# Altium integrated library myIOT_lib.IntLib: 300 symbols (part 1 of 3) (continued)
## BD5291FVE-GTR
designator U?
BD5291FVE-GTR  Input/Output Full Swing  Low Input Offset Voltage  Operational Amplifier; Anunda_Code: M1954; MFG: Rohm Semiconductor; Supplier 1: ES; Supplier Part Number 1: 0176-1479-3; MFG P/N: BD5291FVE-GTR
footprint VSOF5 (SOT23, 5-Leads, Body 1.60x1.60mm, Pitch 0.50mm, IPC Medium Density)
pins: 1 IN+ (in), 2 VSS (power), 3 IN- (in), 4 OUT (out), 5 VDD (power)

## BD8306MUV-E2
designator U?
BD8306MUV-E2 Buck-Boost Converter 1.8V to 5.5V integrated 2.0A; Anunda_Code: D1095; MFG: Rohm Semiconductor; Value: BD8306MUV-E2; MFG P/N: BD8306MUV-E2
footprint VQFN016V3030 (QFN, 16-Leads, Body 3.00x3.00mm, Pitch 0.50mm, Thermal Pad 1.40x1.40mm, IPC Medium Density)
pins: 0 TPAD, 1 FB, 2 INV, 3 GND, 4 VOUT, 5 VOUT, 6 LX2, 7 LX2, 8 PGND, 9 PGND, 10 LX1, 11 LX1, 12 PVCC, 13 PVCC, 14 VCC, 15 STB, 16 RT

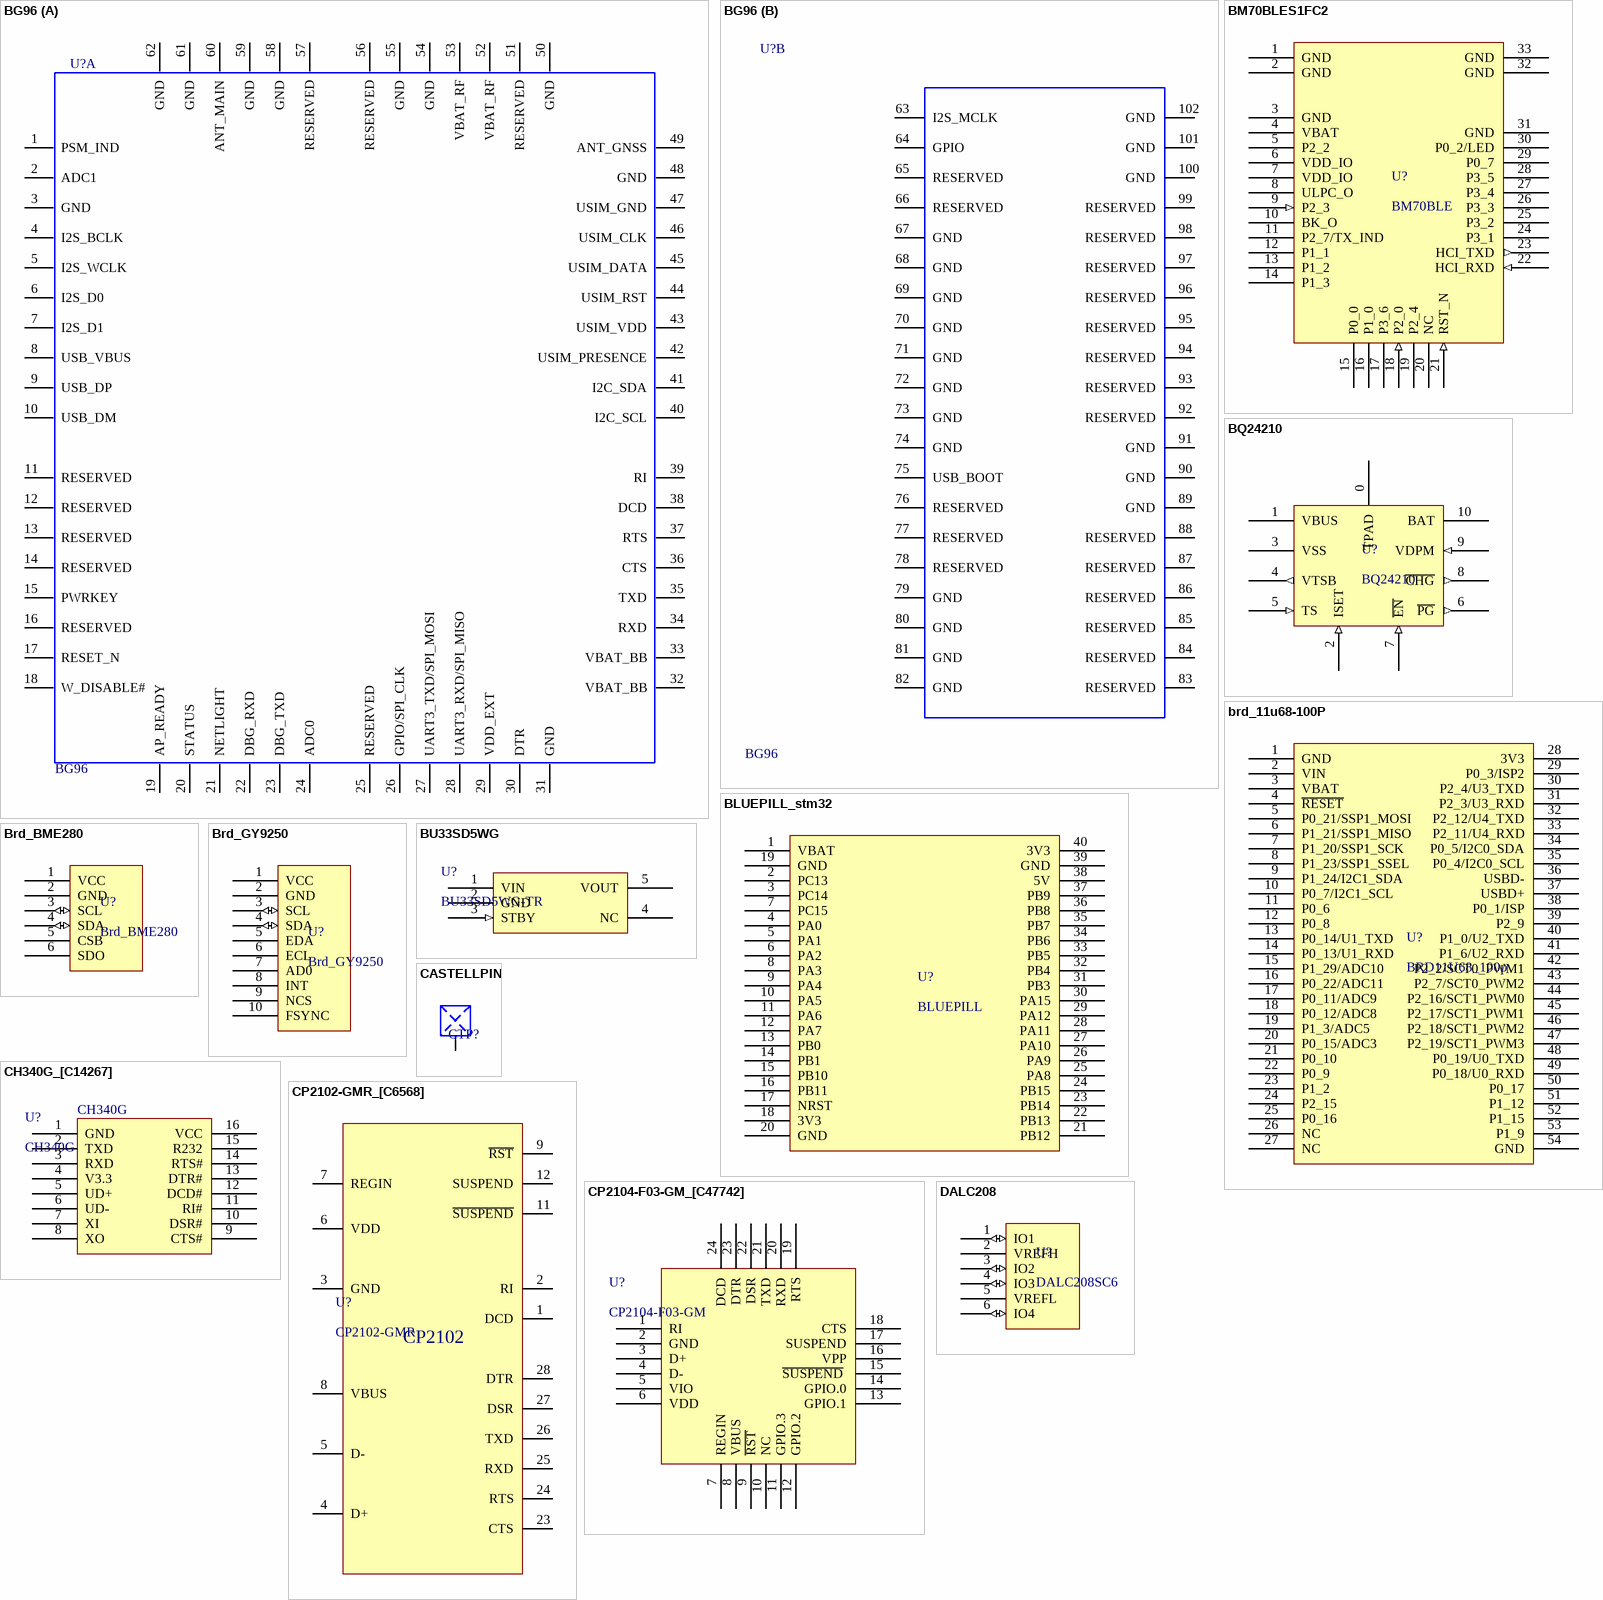
[diagram p4: symbols BG96 to DALC208]

## BG96
designator U?
BG96 IoT NB/Cat.M1 RF Module  Quectel; Value: *; Part Description: *; PCB DECAL: *
footprint BG96 (BG96 IoT NB/Cat.M1 RF Module  Quectel)
part A pins: 1 PSM_IND, 2 ADC1, 3 GND, 4 I2S_BCLK, 5 I2S_WCLK, 6 I2S_D0, 7 I2S_D1, 8 USB_VBUS, 9 USB_DP, 10 USB_DM, 11 RESERVED, 12 RESERVED, 13 RESERVED, 14 RESERVED, 15 PWRKEY, 16 RESERVED, 17 RESET_N, 18 W_DISABLE#, 19 AP_READY, 20 STATUS, 21 NETLIGHT, 22 DBG_RXD, 23 DBG_TXD, 24 ADC0, 25 RESERVED, 26 GPIO/SPI_CLK, 27 UART3_TXD/SPI_MOSI, 28 UART3_RXD/SPI_MISO, 29 VDD_EXT, 30 DTR, 31 GND, 32 VBAT_BB, 33 VBAT_BB, 34 RXD, 35 TXD, 36 CTS, 37 RTS, 38 DCD, 39 RI, 40 I2C_SCL, 41 I2C_SDA, 42 USIM_PRESENCE, 43 USIM_VDD, 44 USIM_RST, 45 USIM_DATA, 46 USIM_CLK, 47 USIM_GND, 48 GND, 49 ANT_GNSS, 50 GND, 51 RESERVED, 52 VBAT_RF, 53 VBAT_RF, 54 GND, 55 GND, 56 RESERVED, 57 RESERVED, 58 GND, 59 GND, 60 ANT_MAIN, 61 GND, 62 GND
part B pins: 63 I2S_MCLK, 64 GPIO, 65 RESERVED, 66 RESERVED, 67 GND, 68 GND, 69 GND, 70 GND, 71 GND, 72 GND, 73 GND, 74 GND, 75 USB_BOOT, 76 RESERVED, 77 RESERVED, 78 RESERVED, 79 GND, 80 GND, 81 GND, 82 GND, 83 RESERVED, 84 RESERVED, 85 RESERVED, 86 RESERVED, 87 RESERVED, 88 RESERVED, 89 GND, 90 GND, 91 GND, 92 RESERVED, 93 RESERVED, 94 RESERVED, 95 RESERVED, 96 RESERVED, 97 RESERVED, 98 RESERVED, 99 RESERVED, 100 GND, 101 GND, 102 GND
2 alternate drawings of the same symbol

## BLUEPILL_stm32
designator U?, comment BLUEPILL
Arduino STM32F103C8T6 ARM STM32 with Bootloader; Anunda_Code: N2111
footprint BLUEPILL_STM32
pins: 1 VBAT, 2 PC13, 3 PC14 (power), 4 PA0 (power), 5 PA1, 6 PA2, 7 PC15, 8 PA3, 9 PA4, 10 PA5, 11 PA6, 12 PA7, 13 PB0, 14 PB1, 15 PB10, 16 PB11, 17 NRST, 18 3V3, 19 GND, 20 GND, 21 PB12, 22 PB13, 23 PB14, 24 PB15, 25 PA8, 26 PA9, 27 PA10, 28 PA11, 29 PA12, 30 PA15, 31 PB3, 32 PB4, 33 PB5, 34 PB6, 35 PB7, 36 PB8, 37 PB9, 38 5V, 39 GND, 40 3V3

## BM70BLES1FC2
designator U?, comment BM70BLE
BM70BLES1FC2  Bluetooth 5 (BLE) Module Integrated Ant 1.9-3.6Vrate; Anunda_Code: N2414
footprint BM70BLES1 (Footprint for BM70BLES1FC2)
pins: 1 GND, 2 GND, 3 GND, 4 VBAT (power), 5 P2_2, 6 VDD_IO, 7 VDD_IO, 8 ULPC_O, 9 P2_3 (in), 10 BK_O, 11 P2_7/TX_IND, 12 P1_1, 13 P1_2, 14 P1_3, 15 P0_0, 16 P1_0, 17 P3_6, 18 P2_0 (in), 19 P2_4, 20 NC, 21 RST_N (in), 22 HCI_RXD (in), 23 HCI_TXD (out), 24 P3_1, 25 P3_2, 26 P3_3, 27 P3_4, 28 P3_5, 29 P0_7, 30 P0_2/LED, 31 GND, 32 GND, 33 GND

## BQ24210
designator U?
bq24210 800-mA, Single-Input, Single-Cell Li-Ion Battery Solar Charger; Anunda_Code: M1972; Value: BQ24210
footprint 10-WSON_2x3 (SON, 10-Leads, Body 3.00x2.00mm, Pitch 0.50mm, Thermal Pad 2.40x0.79mm, IPC Medium Density)
pins: 0 TPAD "Thermal Pad Net", 1 VBUS, 2 ISET (in), 3 VSS, 4 VTSB (out), 5 TS (in), 6 ~{PG} (out), 7 ~{EN} (in), 8 ~{CHG} (out), 9 VDPM (in), 10 BAT

## brd_11u68-100P
designator U?, comment BRD11U68_100p
footprint BRD_11u68-100p
pins: 1 GND, 2 VIN, 3 VBAT, 4 ~{RESET}, 5 P0_21/SSP1_MOSI, 6 P1_21/SSP1_MISO, 7 P1_20/SSP1_SCK, 8 P1_23/SSP1_SSEL, 9 P1_24/I2C1_SDA, 10 P0_7/I2C1_SCL, 11 P0_6, 12 P0_8, 13 P0_14/U1_TXD, 14 P0_13/U1_RXD, 15 P1_29/ADC10, 16 P0_22/ADC11, 17 P0_11/ADC9, 18 P0_12/ADC8, 19 P1_3/ADC5, 20 P0_15/ADC3, 21 P0_10, 22 P0_9, 23 P1_2, 24 P2_15, 25 P0_16, 26 NC, 27 NC, 28 3V3, 29 P0_3/ISP2, 30 P2_4/U3_TXD, 31 P2_3/U3_RXD, 32 P2_12/U4_TXD, 33 P2_11/U4_RXD, 34 P0_5/I2C0_SDA, 35 P0_4/I2C0_SCL, 36 USBD-, 37 USBD+, 38 P0_1/ISP, 39 P2_9, 40 P1_0/U2_TXD, 41 P1_6/U2_RXD, 42 P2_2/SCT0_PWM1, 43 P2_7/SCT0_PWM2, 44 P2_16/SCT1_PWM0, 45 P2_17/SCT1_PWM1, 46 P2_18/SCT1_PWM2, 47 P2_19/SCT1_PWM3, 48 P0_19/U0_TXD, 49 P0_18/U0_RXD, 50 P0_17, 51 P1_12, 52 P1_15, 53 P1_9, 54 GND

## Brd_BME280
designator U?
Module BME280
footprint BRD_BME280_PL850 (SAMTECH 2.54mm Header 4.85mm insulator)
pins: 1 VCC, 2 GND, 3 SCL (io), 4 SDA (io), 5 CSB, 6 SDO

## Brd_GY9250
designator U?
Module GY9250
footprint BRD_GY9250
pins: 1 VCC, 2 GND, 3 SCL (io), 4 SDA (io), 5 EDA, 6 ECL, 7 AD0, 8 INT, 9 NCS, 10 FSYNC

## BU33SD5WG
designator U?, comment BU33SD5WG-TR
CMOS LDO Regulators 1Ch 3.3V/500mA Accuracy ±2%, for Portable Equipment; Anunda_Code: M2160; MFG: Rohm Semiconductor; Value: BU33SD5WG-TR; MFG P/N: BU33SD5WG-TR
footprint SOT-23-5
pins: 1 VIN (power), 2 GND, 3 STBY (in), 4 NC, 5 VOUT (power)

## CASTELLPIN
designator CTP?  (net tie, no BOM)
Edge Castellation PCB pin; ClassName: CASTELLPIN
footprint CASTELLPIN
pins: 1 a

## CH340G_[C14267]
designator U?, comment CH340G
USB; Package: SOIC-16_150mil; Supplier: LC; SuppliersPartNumber: C14267
footprint SOIC-16_150mil
pins: 1 GND, 2 TXD, 3 RXD, 4 V3.3, 5 UD+, 6 UD-, 7 XI, 8 XO, 9 CTS#, 10 DSR#, 11 RI#, 12 DCD#, 13 DTR#, 14 RTS#, 15 R232, 16 VCC

## CP2102-GMR_[C6568]
designator U?, comment CP2102-GMR
USB; Package: QFN-28_5x5x05P; Supplier: LC; SuppliersPartNumber: C6568
footprint QFN-28_5x5x05P
pins: 1 DCD, 2 RI, 3 GND, 4 D+, 5 D-, 6 VDD, 7 REGIN, 8 VBUS, 9 ~{RST}, 11 ~{SUSPEND}, 12 SUSPEND, 23 CTS, 24 RTS, 25 RXD, 26 TXD, 27 DSR, 28 DTR
text: CP2102

## CP2104-F03-GM_[C47742]
designator U?, comment CP2104-F03-GM
USB; Package: QFN-24_4x4x05P; Supplier: LC; SuppliersPartNumber: C47742
footprint QFN-24_4x4x05P
pins: 1 RI, 2 GND, 3 D+, 4 D-, 5 VIO, 6 VDD, 7 REGIN, 8 VBUS, 9 ~{RST}, 10 NC, 11 GPIO.3, 12 GPIO.2, 13 GPIO.1, 14 GPIO.0, 15 ~{SUSPEND} , 16 VPP, 17 SUSPEND, 18 CTS, 19 RTS, 20 RXD, 21 TXD, 22 DSR, 23 DTR, 24 DCD

## DALC208
designator U?, comment DALC208SC6
Diode DALC208SC6 Diode suppresssor 9V SOT23-6; Anunda_Code: M1349; MFG: STMicroelectronics; Value: DALC208SC6; MFG P/N: DALC208SC6
footprint SOT23-6
pins: 1 IO1 (io), 2 VREFH, 3 IO2 (io), 4 IO3 (io), 5 VREFL, 6 IO4 (io)

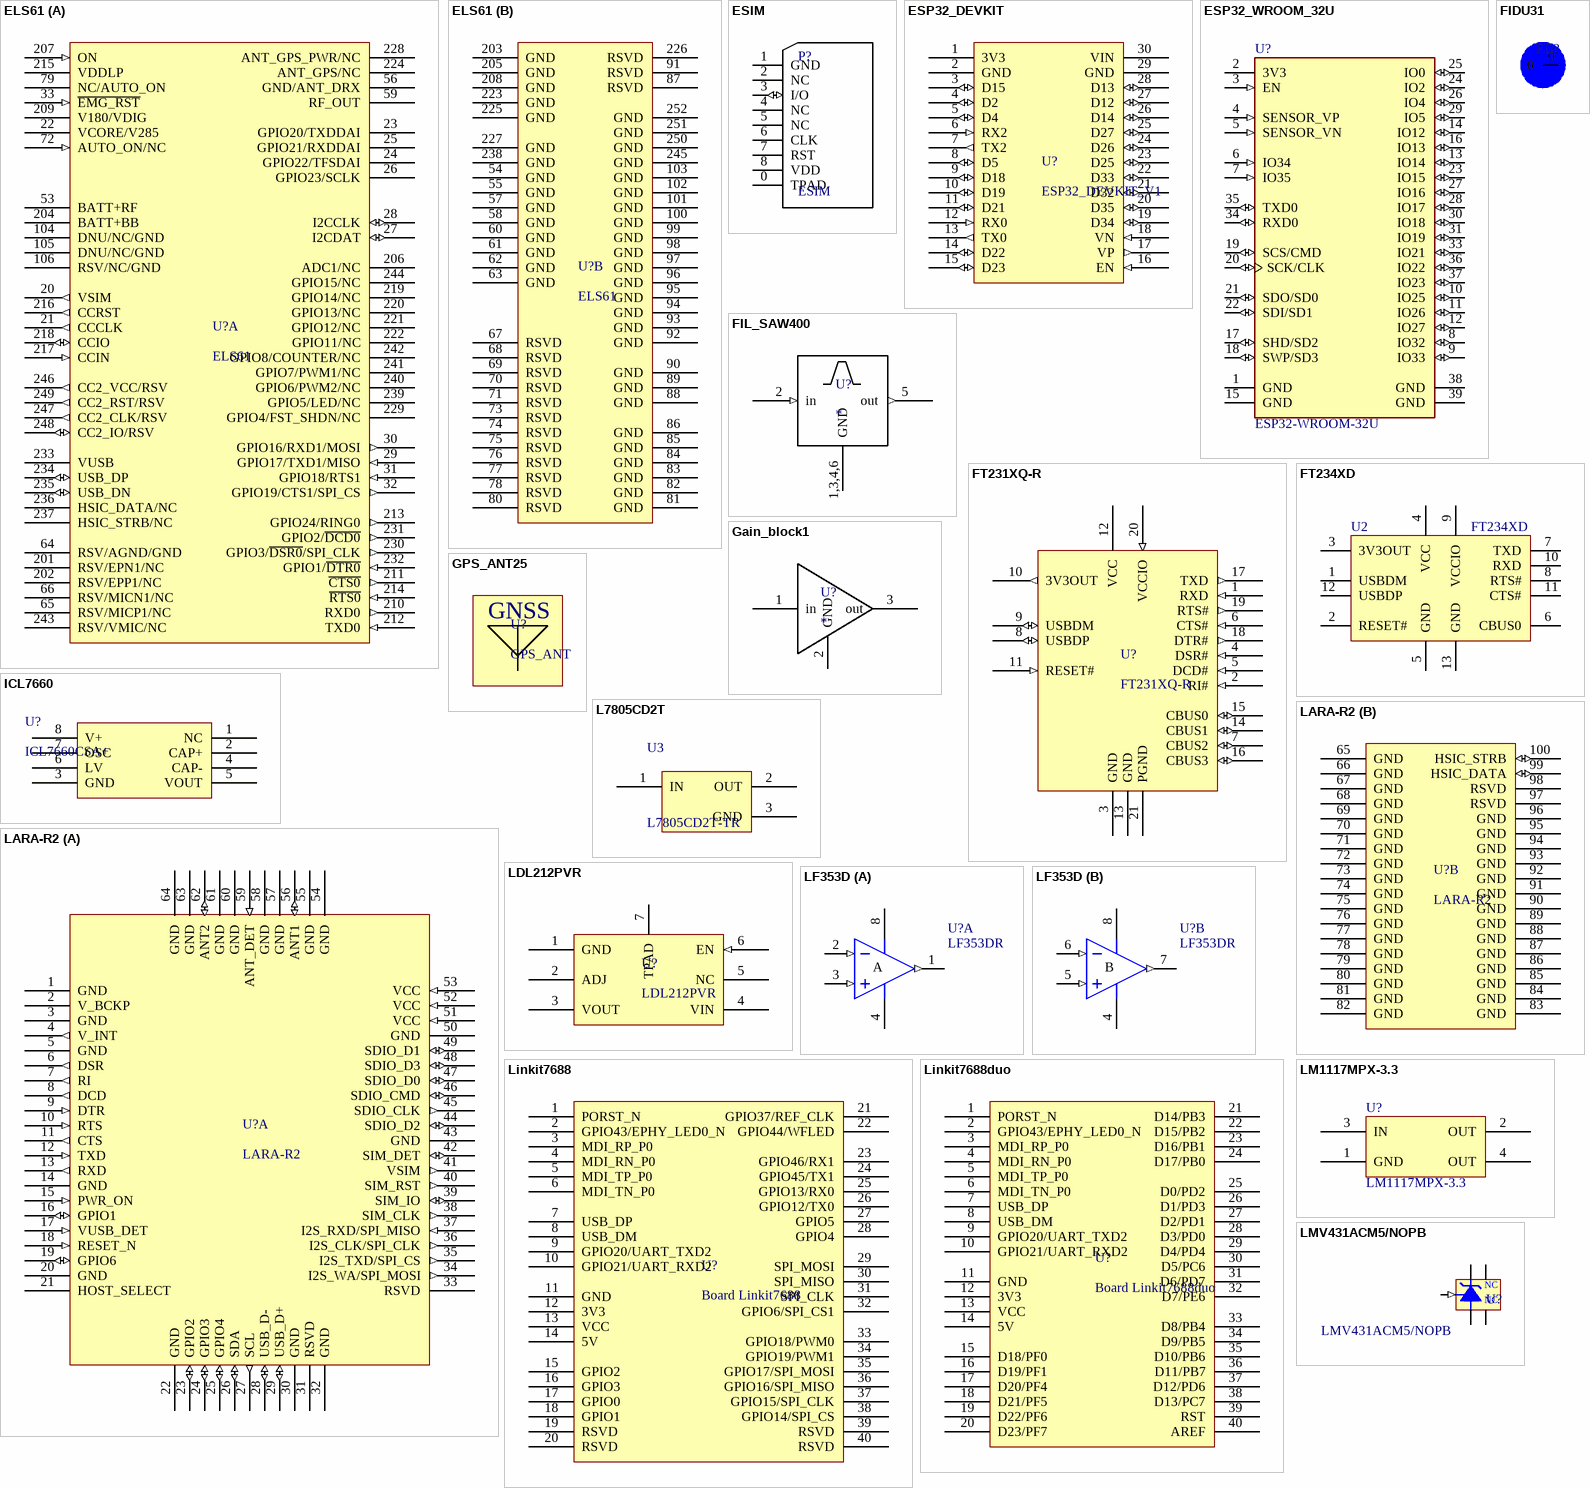
[diagram p5: symbols ELS61 to LMV431ACM5/NOPB]

## ELS61
designator U?
Value: ELS61
footprint ELS61
part A pins: 20 VSIM (out), 21 CCCLK (out), 22 VCORE/V285, 23 GPIO20/TXDDAI, 24 GPIO22/TFSDAI, 25 GPIO21/RXDDAI, 26 GPIO23/SCLK, 27 I2CDAT (io), 28 I2CCLK (io), 29 GPIO17/TXD1/MISO (in), 30 GPIO16/RXD1/MOSI (out), 31 GPIO18/RTS1 (in), 32 GPIO19/CTS1/SPI_CS (out), 33 ~{EMG_RST} (in), 53 BATT+RF (power), 56 GND/ANT_DRX, 59 RF_OUT, 64 RSV/AGND/GND, 65 RSV/MICP1/NC, 66 RSV/MICN1/NC, 72 AUTO_ON/NC (in), 79 NC/AUTO_ON, 104 DNU/NC/GND, 105 DNU/NC/GND, 106 RSV/NC/GND, 201 RSV/EPN1/NC, 202 RSV/EPP1/NC, 204 BATT+BB (power), 206 ADC1/NC, 207 ON (in), 209 V180/VDIG, 210 RXD0 (out), 211 ~{CTS0} (out), 212 TXD0 (in), 213 GPIO24/RING0 (out), 214 ~{RTS0} (in), 215 VDDLP, 216 CCRST (out), 217 CCIN (in), 218 CCIO (io), 219 GPIO14/NC, 220 GPIO13/NC, 221 GPIO12/NC, 222 GPIO11/NC, 224 ANT_GPS/NC, 228 ANT_GPS_PWR/NC, 229 GPIO4/FST_SHDN/NC, 230 GPIO3/~{DSR0}/SPI_CLK (out), 231 GPIO2/~{DCD0} (out), 232 GPIO1/~{DTR0} (in), 233 VUSB, 234 USB_DP (io), 235 USB_DN (io), 236 HSIC_DATA/NC, 237 HSIC_STRB/NC, 239 GPIO5/LED/NC, 240 GPIO6/PWM2/NC, 241 GPIO7/PWM1/NC, 242 GPIO8/COUNTER/NC, 243 RSV/VMIC/NC, 244 GPIO15/NC, 246 CC2_VCC/RSV (out), 247 CC2_CLK/RSV (out), 248 CC2_IO/RSV (io), 249 CC2_RST/RSV (out)
part B pins: 54 GND, 55 GND, 57 GND, 58 GND, 60 GND, 61 GND, 62 GND, 63 GND, 67 RSVD, 68 RSVD, 69 RSVD, 70 RSVD, 71 RSVD, 73 RSVD, 74 RSVD, 75 RSVD, 76 RSVD, 77 RSVD, 78 RSVD, 80 RSVD, 81 GND, 82 GND, 83 GND, 84 GND, 85 GND, 86 GND, 87 RSVD, 88 GND, 89 GND, 90 GND, 91 RSVD, 92 GND, 93 GND, 94 GND, 95 GND, 96 GND, 97 GND, 98 GND, 99 GND, 100 GND, 101 GND, 102 GND, 103 GND, 203 GND, 205 GND, 208 GND, 223 GND, 225 GND, 226 RSVD, 227 GND, 238 GND, 245 GND, 250 GND, 251 GND, 252 GND

## ESIM
designator P?
MFF2 5x6 mm eSIM QFN-8
footprint MFF2-eSIM (QFN, 8-Leads, Body 6.08x5.08mm, Pitch 1.27mm, Thermal Pad 3.45x4.25mm, IPC Medium Density)
pins: 0 TPAD, 1 GND, 2 NC, 3 I/O (io), 4 NC, 5 NC, 6 CLK, 7 RST, 8 VDD

## ESP32_DEVKIT
designator U?, comment ESP32_DEVKIT_V1
Value: ESP32_DEVKIT_V1
footprint ESP32_DEV_KIT
pins: 1 3V3 (power), 2 GND (power), 3 D15 (io), 4 D2 (io), 5 D4 (io), 6 RX2 (in), 7 TX2 (out), 8 D5 (io), 9 D18 (io), 10 D19 (io), 11 D21 (io), 12 RX0 (in), 13 TX0 (out), 14 D22 (io), 15 D23 (io), 16 EN (in), 17 VP (out), 18 VN (in), 19 D34 (io), 20 D35 (io), 21 D32 (io), 22 D33 (io), 23 D25 (io), 24 D26 (io), 25 D27 (io), 26 D14 (io), 27 D12 (io), 28 D13 (io), 29 GND (power), 30 VIN (power)

## ESP32_WROOM_32U
designator U?, comment ESP32-WROOM-32U
Espressif Systems ESP32-WROOM-32U Module; MFG P/N: ESP32-WROOM-32D; Replacement: ESP32-WROOM-32D (ES:1082-0002-1); Anunda_Code: N2700; Supplier: ES:1082-0005-7; UnitPrice: 131.80 THB
footprint ESP32
pins: 1 GND (power), 2 3V3 (power), 3 EN (in), 4 SENSOR_VP (in), 5 SENSOR_VN (in), 6 IO34 (in), 7 IO35 (in), 8 IO32 (io), 9 IO33 (io), 10 IO25 (io), 11 IO26 (io), 12 IO27 (io), 13 IO14 (io), 14 IO12 (io), 15 GND (power), 16 IO13 (io), 17 SHD/SD2 (io), 18 SWP/SD3 (io), 19 SCS/CMD (io), 20 SCK/CLK (io), 21 SDO/SD0 (io), 22 SDI/SD1 (io), 23 IO15 (io), 24 IO2 (io), 25 IO0 (io), 26 IO4 (io), 27 IO16 (io), 28 IO17 (io), 29 IO5 (io), 30 IO18 (io), 31 IO19 (io), 33 IO21 (io), 34 RXD0 (io), 35 TXD0 (io), 36 IO22 (io), 37 IO23 (io), 38 GND (power), 39 GND (power)

## FIDU31
designator FD?  (value not drawn)  (net tie, no BOM)
footprint FIDUCIAL_13
pins: 0

## FIL_SAW400
designator U?
footprint SAW3X3 (SAW Filter 3*3*1 mm 6-pins)
pins: 1,3,4,6 GND, 2 in (in), 5 out (out)

## FT231XQ-R
designator U?
IC FT231XQ-R USB to Serial UART Interface w/ Dull Modem CTRL; Anunda_Code: D0963
footprint QFN20 (QFN, 20-Leads, Body 4.00x4.00mm, Pitch 0.50mm, Thermal Pad 1.98x1.98mm, IPC Medium Density)
pins: 1 RXD (in), 2 RI# (in), 3 GND, 4 DSR# (in), 5 DCD# (in), 6 CTS# (in), 7 CBUS2 (io), 8 USBDP (io), 9 USBDM (io), 10 3V3OUT (out), 11 RESET# (in), 12 VCC (power), 13 GND, 14 CBUS1 (io), 15 CBUS0 (io), 16 CBUS3 (io), 17 TXD (out), 18 DTR# (out), 19 RTS# (out), 20 VCCIO (in), 21 PGND

## FT234XD
designator U2
M1728 IC FT234XD-R USB to Serial UART 12DFN
footprint DFN12_3x3 (SON, 12-Leads, Body 3.00x3.00mm, Pitch 0.45mm, Thermal Pad 2.48x1.58mm, IPC Medium Density)
pins: 1 USBDM, 2 RESET#, 3 3V3OUT, 4 VCC, 5 GND, 6 CBUS0, 7 TXD, 8 RTS#, 9 VCCIO, 10 RXD, 11 CTS#, 12 USBDP, 13 GND

## Gain_block1
designator U?
footprint SOT-89-MB3_M (SOT89, 3-Leads, Body 4.5x2.4 mm, Pitch 1.5mm, Lead Span 4.1mm, IPC Low Density)
pins: 1 in, 2 GND, 3 out

## GPS_ANT25
designator U?, comment GPS_ANT
GNSS active antenna 25x25 mm
footprint GPS_ANT25BACK (dimension25x25x4.5)
text: GNSS

## ICL7660
designator U?, comment ICL7660CSA+
IC ICL7660CSA+ Regulator Charge Pump INV 20mA 8-SO; Anunda_Code: M2075; MFG P/N: ICL7660CSA+-ND; Value: ICL7660CSA+
footprint SOIC127P600X175-8N (SOIC, 8-Leads, Body 4.90x3.90mm, Pitch 1.27mm, IPC Medium Density)
pins: 1 NC, 2 CAP+, 3 GND, 4 CAP-, 5 VOUT, 6 LV, 7 OSC, 8 V+

## L7805CD2T
designator U3, comment L7805CD2T-TR
IC 7805 Regulator 5V D2PAK; Anunda_Code: M0693; Value: L7805CD2T-TR
footprint D2PAK (D2-PAK, 3-Pads, Body 9.35x10.4mm (max), IPC Medium Density)
pins: 1 IN (power), 2 OUT (power), 3 GND (power)

## LARA-R2
designator U?
LARA MODULE UBLOX; Value: LARA-R2
footprint SARA_LARA (SARA UBLOX MODULE)
part A pins: 1 GND, 2 V_BCKP, 3 GND, 4 V_INT (out), 5 GND, 6 DSR (out), 7 RI (out), 8 DCD (out), 9 DTR (in), 10 RTS (in), 11 CTS (out), 12 TXD (in), 13 RXD (out), 14 GND, 15 PWR_ON (in), 16 GPIO1 (io), 17 VUSB_DET (in), 18 RESET_N (in), 19 GPIO6 (io), 20 GND, 21 HOST_SELECT, 22 GND, 23 GPIO2 (io), 24 GPIO3 (io), 25 GPIO4 (io), 26 SDA (io), 27 SCL (out), 28 USB_D- (io), 29 USB_D+ (io), 30 GND, 31 RSVD, 32 GND, 33 RSVD, 34 I2S_WA/SPI_MOSI (out), 35 I2S_TXD/SPI_CS (out), 36 I2S_CLK/SPI_CLK (out), 37 I2S_RXD/SPI_MISO (in), 38 SIM_CLK (out), 39 SIM_IO (io), 40 SIM_RST (out), 41 VSIM (out), 42 SIM_DET (io), 43 GND, 44 SDIO_D2 (io), 45 SDIO_CLK (out), 46 SDIO_CMD (io), 47 SDIO_D0 (io), 48 SDIO_D3 (io), 49 SDIO_D1 (io), 50 GND, 51 VCC (in), 52 VCC (in), 53 VCC (in), 54 GND, 55 GND, 56 ANT1 (io), 57 GND, 58 GND, 59 ANT_DET (in), 60 GND, 61 GND, 62 ANT2 (io), 63 GND, 64 GND
part B pins: 65 GND, 66 GND, 67 GND, 68 GND, 69 GND, 70 GND, 71 GND, 72 GND, 73 GND, 74 GND, 75 GND, 76 GND, 77 GND, 78 GND, 79 GND, 80 GND, 81 GND, 82 GND, 83 GND, 84 GND, 85 GND, 86 GND, 87 GND, 88 GND, 89 GND, 90 GND, 91 GND, 92 GND, 93 GND, 94 GND, 95 GND, 96 GND, 97 RSVD, 98 RSVD, 99 HSIC_DATA (io), 100 HSIC_STRB (io)

## LDL212PVR
designator U?
IC LDL212PVR Regulator LIN 1.18V 1.2A 6-WFDFN; Anunda_Code: M1927
footprint DFN6_2x2 (SON, 6-Leads, Body 2.00x2.00mm, Pitch 0.50mm, Thermal Pad 1.43x0.78mm, IPC Medium Density)
pins: 1 GND, 2 ADJ, 3 VOUT (power), 4 VIN (power), 5 NC, 6 EN (in), 7 TPAD

## LF353D
designator U?, comment LF353DR
IC LF353DR J-FET OP-AMP 2 Circuit 8-SOIC; Anunda_Code: M2071; Published: 16-Jan-2001; LatestRevisionDate: 13-Apr-2006; LatestRevisionNote: IPC-7351 Footprint Added.; DatasheetVersion: Aug-1994; PackageVersion: Jan-1998; PackageReference: D008; Publisher: Altium Limited; PackageDescription: 8-Pin Small Outline Integrated Circuit 1.27 mm Pitch; Code_IPC: SOIC127P600-8; Value: LF353DR
footprint SOIC-8_150mil
simulation model LF353 (SUBCKT)
pins on every part: 4 V- (power), 8 V+ (power)
part A pins: 1 OUT (out), 2 IN- (in), 3 IN+ (in)
part B pins: 5 IN+ (in), 6 IN- (in), 7 OUT (out)
part A text: A
part B text: B

## Linkit7688
designator U?, comment Board Linkit7688
Linkit Smart 7688 (102110018) Controller; Anunda_Code: N2073
footprint Linkit7688Duo (Board Linkit7688 Duo 40 pin)
pins: 1 PORST_N, 2 GPIO43/EPHY_LED0_N, 3 MDI_RP_P0, 4 MDI_RN_P0, 5 MDI_TP_P0, 6 MDI_TN_P0, 7 USB_DP, 8 USB_DM, 9 GPIO20/UART_TXD2, 10 GPIO21/UART_RXD2, 11 GND, 12 3V3, 13 VCC, 14 5V, 15 GPIO2, 16 GPIO3, 17 GPIO0, 18 GPIO1, 19 RSVD, 20 RSVD, 21 GPIO37/REF_CLK, 22 GPIO44/WFLED, 23 GPIO46/RX1, 24 GPIO45/TX1, 25 GPIO13/RX0, 26 GPIO12/TX0, 27 GPIO5, 28 GPIO4, 29 SPI_MOSI, 30 SPI_MISO, 31 SPI_CLK, 32 GPIO6/SPI_CS1, 33 GPIO18/PWM0, 34 GPIO19/PWM1, 35 GPIO17/SPI_MOSI, 36 GPIO16/SPI_MISO, 37 GPIO15/SPI_CLK, 38 GPIO14/SPI_CS, 39 RSVD, 40 RSVD

## Linkit7688duo
designator U?, comment Board Linkit7688duo
footprint Linkit7688Duo (Board Linkit7688 Duo 40 pin)
pins: 1 PORST_N, 2 GPIO43/EPHY_LED0_N, 3 MDI_RP_P0, 4 MDI_RN_P0, 5 MDI_TP_P0, 6 MDI_TN_P0, 7 USB_DP, 8 USB_DM, 9 GPIO20/UART_TXD2, 10 GPIO21/UART_RXD2, 11 GND, 12 3V3, 13 VCC, 14 5V, 15 D18/PF0, 16 D19/PF1, 17 D20/PF4, 18 D21/PF5, 19 D22/PF6, 20 D23/PF7, 21 D14/PB3, 22 D15/PB2, 23 D16/PB1, 24 D17/PB0, 25 D0/PD2, 26 D1/PD3, 27 D2/PD1, 28 D3/PD0, 29 D4/PD4, 30 D5/PC6, 31 D6/PD7, 32 D7/PE6, 33 D8/PB4, 34 D9/PB5, 35 D10/PB6, 36 D11/PB7, 37 D12/PD6, 38 D13/PC7, 39 RST, 40 AREF

## LM1117MPX-3.3
designator U?
IC LM1117MPX-3.3/NOPB Reg LDO 3.3V 800mA SOT-223; Anunda_Code: M2121
footprint SOT223-3 (SOT-223/SC-73; 4 Leads; Body 6.7 x 7.3 mm, inc. leads (LxW max))
pins: 1 GND (power), 2 OUT (power), 3 IN (power), 4 OUT (power)

## LMV431ACM5/NOPB
designator U?
Low-Voltage (1.24V) Adjustable Precision Shunt Regulators, 5-pin SOT-23, Pb-Free; PackageTopMarking: N09A*XTT; PowerWise: N; Published: 1-Mar-2010; DatasheetVersion: May-2005; PackageVersion: revD, Aug-2008; PackageReference: MF05A; Publisher: Altium Limited; PackageDescription: Molded SOT-23, .115 x .063 x .040 in Body, 5 Lead, .0375 in Pitch; Supplier 1: Digi-Key; Supplier Part Number 1: LMV431ACM5/NOPBTR-ND; Supplier 2: Digi-Key; Supplier Part Number 2: LMV431ACM5/NOPBCT-ND; Supplier 3: Digi-Key; Supplier Part Number 3: LMV431ACM5/NOPBDKR-ND; Supplier 4: ES; Supplier Part Number 4: 0086-0744-1; MFG P/N: LMV431ACM5/NOPB; RoHS: Y; PinCount: 5
footprint SOT235 (SOT23, 5-Leads, Body 2.90x2.80mm, Pitch 0.95mm, IPC Medium Density)
footprint MF05A_L (SOT23, 5-Leads, Body 2.9x1.6mm, Pitch 0.95mm, Lead Span 2.8mm, IPC High Density)
footprint MF05A_M (SOT23, 5-Leads, Body 2.9x1.6mm, Pitch 0.95mm, Lead Span 2.8mm, IPC Low Density)
pins: 1 NC, 2 NC, 3 K, 4 REF (in), 5 A

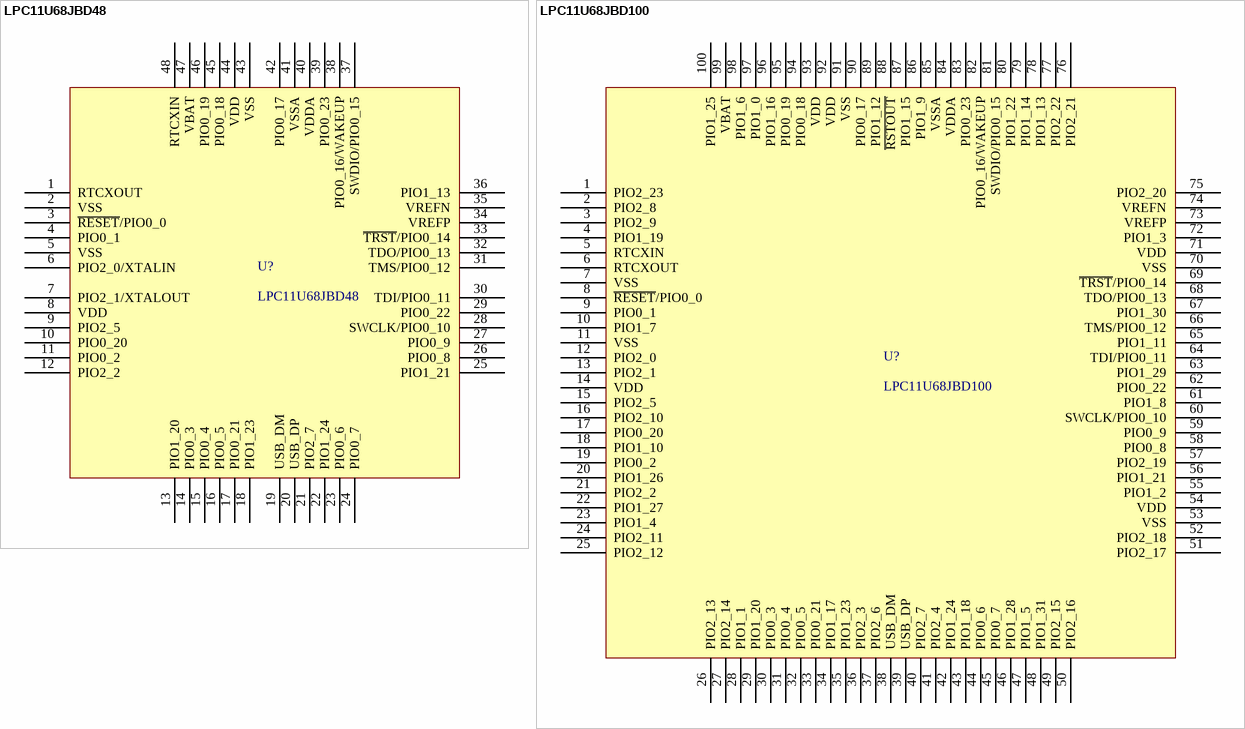
[diagram p6: symbols LPC11U68JBD48 to LPC11U68JBD100]

## LPC11U68JBD48
designator U?
LPC11U68JBD48  Cortex-M0+  NXP MCU
footprint LQFP-48_N (48-Pin Thin Quad Flat Pack 0.5 mm Pitch, IPC Medium Density)
pins: 1 RTCXOUT, 2 VSS, 3 ~{RESET}/PIO0_0, 4 PIO0_1, 5 VSS, 6 PIO2_0/XTALIN, 7 PIO2_1/XTALOUT, 8 VDD, 9 PIO2_5, 10 PIO0_20, 11 PIO0_2, 12 PIO2_2, 13 PIO1_20, 14 PIO0_3, 15 PIO0_4, 16 PIO0_5, 17 PIO0_21, 18 PIO1_23, 19 USB_DM, 20 USB_DP, 21 PIO2_7, 22 PIO1_24, 23 PIO0_6, 24 PIO0_7, 25 PIO1_21, 26 PIO0_8, 27 PIO0_9, 28 SWCLK/PIO0_10, 29 PIO0_22, 30 TDI/PIO0_11, 31 TMS/PIO0_12, 32 TDO/PIO0_13, 33 ~{TRST}/PIO0_14, 34 VREFP, 35 VREFN, 36 PIO1_13, 37 SWDIO/PIO0_15, 38 PIO0_16/WAKEUP, 39 PIO0_23, 40 VDDA, 41 VSSA, 42 PIO0_17, 43 VSS, 44 VDD, 45 PIO0_18, 46 PIO0_19, 47 VBAT, 48 RTCXIN

## LPC11U68JBD100
designator U?
IC LPC11U68JBD100 MCU 32bit ARM 256KB Flash USB 100pins LQFP-100; Anunda_Code: M1948
footprint LQFP100_N (Thin QFP, 100-Leads, Body 14x14mm, Pitch 0.5mm, IPC Medium Density)
pins: 1 PIO2_23, 2 PIO2_8, 3 PIO2_9, 4 PIO1_19, 5 RTCXIN, 6 RTCXOUT, 7 VSS, 8 ~{RESET}/PIO0_0, 9 PIO0_1, 10 PIO1_7, 11 VSS, 12 PIO2_0, 13 PIO2_1, 14 VDD, 15 PIO2_5, 16 PIO2_10, 17 PIO0_20, 18 PIO1_10, 19 PIO0_2, 20 PIO1_26, 21 PIO2_2, 22 PIO1_27, 23 PIO1_4, 24 PIO2_11, 25 PIO2_12, 26 PIO2_13, 27 PIO2_14, 28 PIO1_1, 29 PIO1_20, 30 PIO0_3, 31 PIO0_4, 32 PIO0_5, 33 PIO0_21, 34 PIO1_17, 35 PIO1_23, 36 PIO2_3, 37 PIO2_6, 38 USB_DM, 39 USB_DP, 40 PIO2_7, 41 PIO2_4, 42 PIO1_24, 43 PIO1_18, 44 PIO0_6, 45 PIO0_7, 46 PIO1_28, 47 PIO1_5, 48 PIO1_31, 49 PIO2_15, 50 PIO2_16, 51 PIO2_17, 52 PIO2_18, 53 VSS, 54 VDD, 55 PIO1_2, 56 PIO1_21, 57 PIO2_19, 58 PIO0_8, 59 PIO0_9, 60 SWCLK/PIO0_10, 61 PIO1_8, 62 PIO0_22, 63 PIO1_29, 64 TDI/PIO0_11, 65 PIO1_11, 66 TMS/PIO0_12, 67 PIO1_30, 68 TDO/PIO0_13, 69 ~{TRST}/PIO0_14, 70 VSS, 71 VDD, 72 PIO1_3, 73 VREFP, 74 VREFN, 75 PIO2_20, 76 PIO2_21, 77 PIO2_22, 78 PIO1_13, 79 PIO1_14, 80 PIO1_22, 81 SWDIO/PIO0_15, 82 PIO0_16/WAKEUP, 83 PIO0_23, 84 VDDA, 85 VSSA, 86 PIO1_9, 87 PIO1_15, 88 ~{RSTOUT}, 89 PIO1_12, 90 PIO0_17, 91 VSS, 92 VDD, 93 VDD, 94 PIO0_18, 95 PIO0_19, 96 PIO1_16, 97 PIO1_0, 98 PIO1_6, 99 VBAT, 100 PIO1_25